# Altium footprint library MYLIB.PcbLib: 600 footprints (part 3 of 39)
Each footprint in its own frame and in the unit in brackets; x right, y up, seen from the top. Pads: shape width x height; smd on the part's side, far side on the other; paste and mask are expansions set on the pad; w line width, h text height; cw(c..) or ccw(c..) is an arc to the next point about the centre after c.
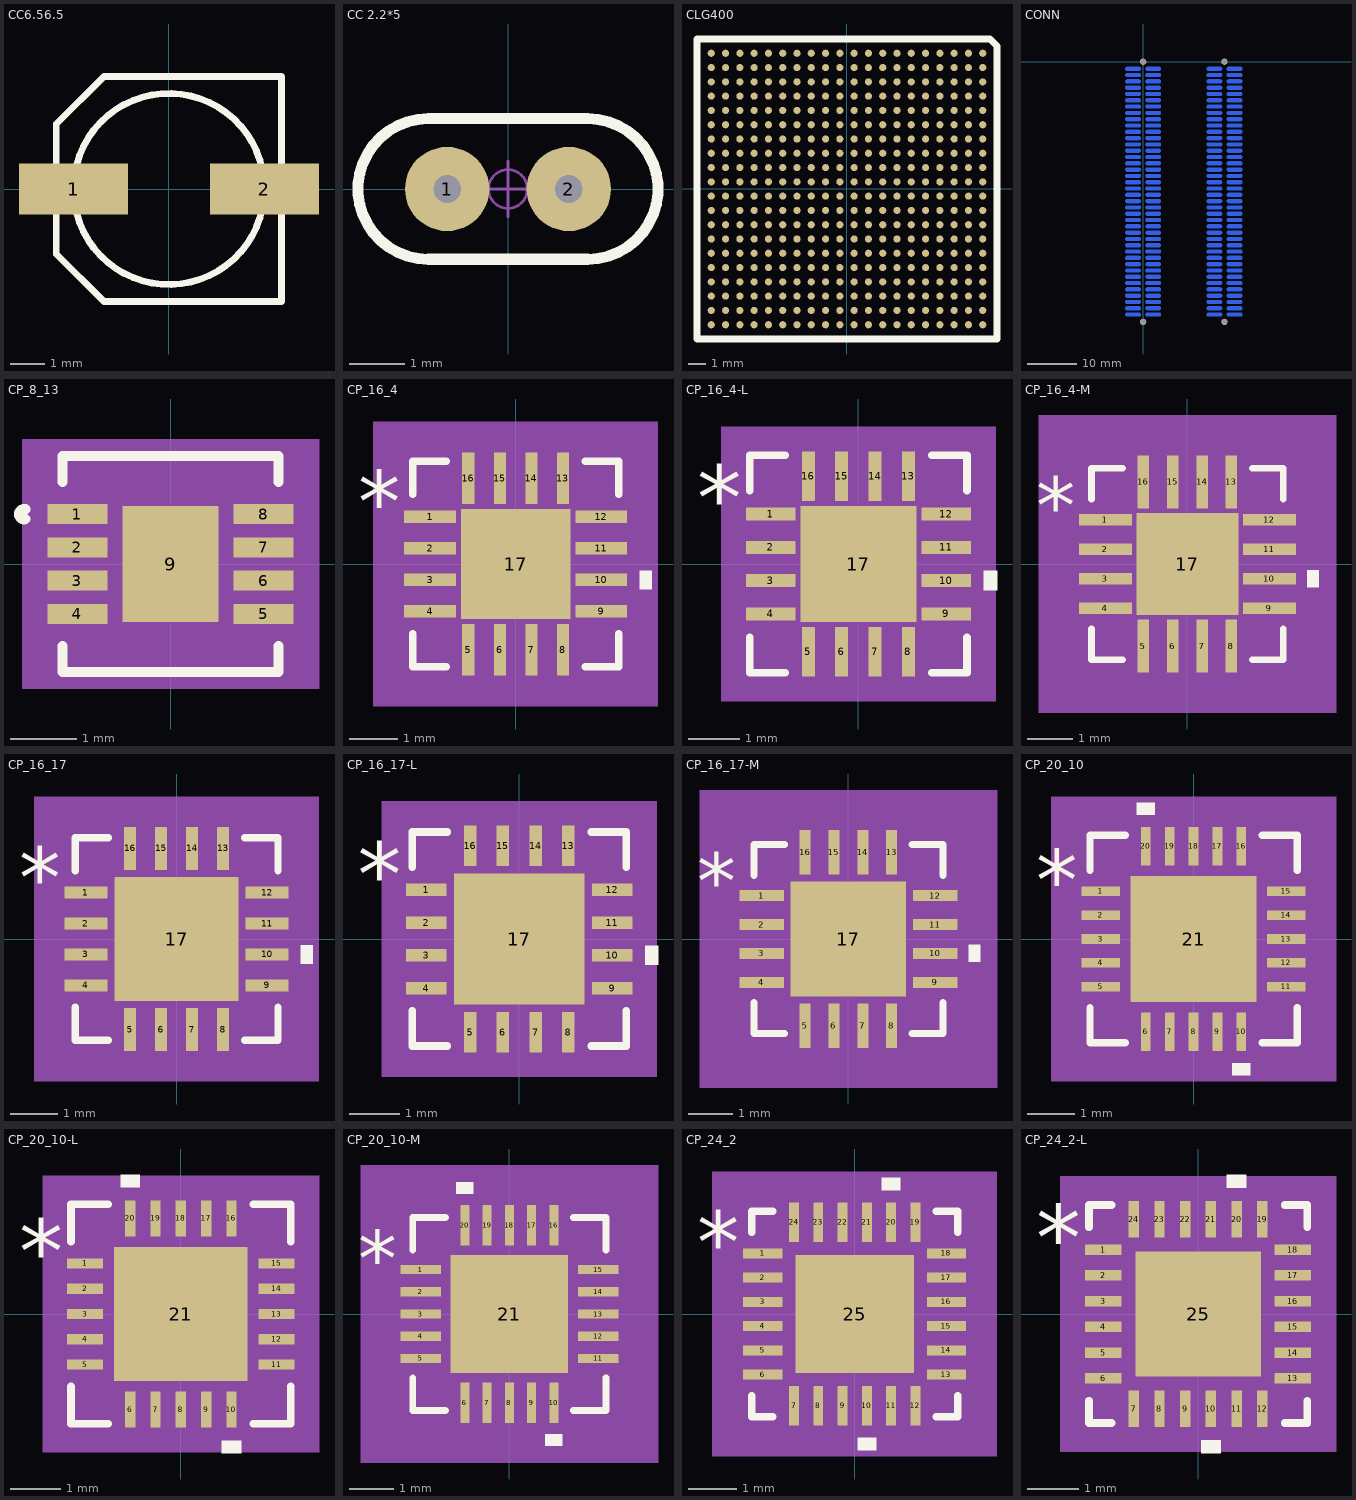
[diagram p2: the footprints below, top view; thin cyan lines are the x and y axes]

## CC6.56.5 [mm]
pads (2):
  rect 3.2x1.5 smd: 1(-2.794,0) 2(2.8,0)
Top Overlay:
  circle w0.2: c0,0 r2.8
  lines w0.2: -3.302,-1.905 -3.302,1.905 -1.905,3.302 3.302,3.302 3.302,-3.302 -1.905,-3.302 -3.302,-1.905

## CC 2.2*5 [mm] "脚距2.2mm直径5mm"
height 6.35
pads (2):
  round 1.524 hole 0.5: 1(-1.1,0) 2(1.1,0)
Top Overlay:
  lines w0.2: -1.44,-1.271 cw(c-1.44,0) -1.44,1.271 1.44,1.271 cw(c1.44,0) 1.44,-1.271 -1.44,-1.269
Mechanical 15:
  circle w0.05: c0,0 r0.35
  lines w0.05: -0.5,0 0.5,0 ; 0,-0.5 0,0.5
3D body "CC 2.2X5.STEP": height 4.8, standoff -3.5, extent -2.4,-0.917 2.4,0.918

## CLG400 [mm]
pads (400):
  round 0.4 smd: A1(7.62,7.595) A2(6.82,7.595) A3(6.02,7.595) A4(5.22,7.595) A5(4.42,7.595) A6(3.62,7.595) A7(2.82,7.595) A8(2.02,7.595) A9(1.22,7.595) A10(0.42,7.595) A11(-0.38,7.595) A12(-1.18,7.595) A13(-1.98,7.595) A14(-2.78,7.595) A15(-3.58,7.595) A16(-4.38,7.595) A17(-5.18,7.595) A18(-5.98,7.595) A19(-6.78,7.595) A20(-7.58,7.595) B1(7.62,6.795) B2(6.82,6.795) B3(6.02,6.795) B4(5.22,6.795) B5(4.42,6.795) B6(3.62,6.795) B7(2.82,6.795) B8(2.02,6.795) B9(1.22,6.795) B10(0.42,6.795) B11(-0.38,6.795) B12(-1.18,6.795) B13(-1.98,6.795) B14(-2.78,6.795) B15(-3.58,6.795) B16(-4.38,6.795) B17(-5.18,6.795) B18(-5.98,6.795) B19(-6.78,6.795) B20(-7.58,6.795) C1(7.62,5.995) C2(6.82,5.995) C3(6.02,5.995) C4(5.22,5.995) C5(4.42,5.995) C6(3.62,5.995) C7(2.82,5.995) C8(2.02,5.995) C9(1.22,5.995) C10(0.42,5.995) C11(-0.38,5.995) C12(-1.18,5.995) C13(-1.98,5.995) C14(-2.78,5.995) C15(-3.58,5.995) C16(-4.38,5.995) C17(-5.18,5.995) C18(-5.98,5.995) C19(-6.78,5.995) C20(-7.58,5.995) D1(7.62,5.195) D2(6.82,5.195) D3(6.02,5.195) D4(5.22,5.195) D5(4.42,5.195) D6(3.62,5.195) D7(2.82,5.195) D8(2.02,5.195) D9(1.22,5.195) D10(0.42,5.195) D11(-0.38,5.195) D12(-1.18,5.195) D13(-1.98,5.195) D14(-2.78,5.195) D15(-3.58,5.195) D16(-4.38,5.195) D17(-5.18,5.195) D18(-5.98,5.195) D19(-6.78,5.195) D20(-7.58,5.195) E1(7.62,4.395) E2(6.82,4.395) E3(6.02,4.395) E4(5.22,4.395) E5(4.42,4.395) E6(3.62,4.395) E7(2.82,4.395) E8(2.02,4.395) E9(1.22,4.395) E10(0.42,4.395) E11(-0.38,4.395) E12(-1.18,4.395) E13(-1.98,4.395) E14(-2.78,4.395) E15(-3.58,4.395) E16(-4.38,4.395) E17(-5.18,4.395) E18(-5.98,4.395) E19(-6.78,4.395) E20(-7.58,4.395) F1(7.62,3.595) F2(6.82,3.595) F3(6.02,3.595) F4(5.22,3.595) F5(4.42,3.595) F6(3.62,3.595) F7(2.82,3.595) F8(2.02,3.595) F9(1.22,3.595) F10(0.42,3.595) F11(-0.38,3.595) F12(-1.18,3.595) F13(-1.98,3.595) F14(-2.78,3.595) F15(-3.58,3.595) F16(-4.38,3.595) F17(-5.18,3.595) F18(-5.98,3.595) F19(-6.78,3.595) F20(-7.58,3.595) G1(7.62,2.795) G2(6.82,2.795) G3(6.02,2.795) G4(5.22,2.795) G5(4.42,2.795) G6(3.62,2.795) G7(2.82,2.795) G8(2.02,2.795) G9(1.22,2.795) G10(0.42,2.795) G11(-0.38,2.795) G12(-1.18,2.795) G13(-1.98,2.795) G14(-2.78,2.795) G15(-3.58,2.795) G16(-4.38,2.795) G17(-5.18,2.795) G18(-5.98,2.795) G19(-6.78,2.795) G20(-7.58,2.795) H1(7.62,1.995) H2(6.82,1.995) H3(6.02,1.995) H4(5.22,1.995) H5(4.42,1.995) H6(3.62,1.995) H7(2.82,1.995) H8(2.02,1.995) H9(1.22,1.995) H10(0.42,1.995) H11(-0.38,1.995) H12(-1.18,1.995) H13(-1.98,1.995) H14(-2.78,1.995) H15(-3.58,1.995) H16(-4.38,1.995) H17(-5.18,1.995) H18(-5.98,1.995) H19(-6.78,1.995) H20(-7.58,1.995) J1(7.62,1.195) J2(6.82,1.195) J3(6.02,1.195) J4(5.22,1.195) J5(4.42,1.195) J6(3.62,1.195) J7(2.82,1.195) J8(2.02,1.195) J9(1.22,1.195) J10(0.42,1.195) J11(-0.38,1.195) J12(-1.18,1.195) J13(-1.98,1.195) J14(-2.78,1.195) J15(-3.58,1.195) J16(-4.38,1.195) J17(-5.18,1.195) J18(-5.98,1.195) J19(-6.78,1.195) J20(-7.58,1.195) K1(7.62,0.395) K2(6.82,0.395) K3(6.02,0.395) K4(5.22,0.395) K5(4.42,0.395) K6(3.62,0.395) K7(2.82,0.395) K8(2.02,0.395) K9(1.22,0.395) K10(0.42,0.395) K11(-0.38,0.395) K12(-1.18,0.395) K13(-1.98,0.395) K14(-2.78,0.395) K15(-3.58,0.395) K16(-4.38,0.395) K17(-5.18,0.395) K18(-5.98,0.395) K19(-6.78,0.395) K20(-7.58,0.395) L1(7.62,-0.405) L2(6.82,-0.405) L3(6.02,-0.405) L4(5.22,-0.405) L5(4.42,-0.405) L6(3.62,-0.405) L7(2.82,-0.405) L8(2.02,-0.405) L9(1.22,-0.405) L10(0.42,-0.405) L11(-0.38,-0.405) L12(-1.18,-0.405) L13(-1.98,-0.405) L14(-2.78,-0.405) L15(-3.58,-0.405) L16(-4.38,-0.405) L17(-5.18,-0.405) L18(-5.98,-0.405) L19(-6.78,-0.405) L20(-7.58,-0.405) M1(7.62,-1.205) M2(6.82,-1.205) M3(6.02,-1.205) M4(5.22,-1.205) M5(4.42,-1.205) M6(3.62,-1.205) M7(2.82,-1.205) M8(2.02,-1.205) M9(1.22,-1.205) M10(0.42,-1.205) M11(-0.38,-1.205) M12(-1.18,-1.205) M13(-1.98,-1.205) M14(-2.78,-1.205) M15(-3.58,-1.205) M16(-4.38,-1.205) M17(-5.18,-1.205) M18(-5.98,-1.205) M19(-6.78,-1.205) M20(-7.58,-1.205) N1(7.62,-2.005) N2(6.82,-2.005) N3(6.02,-2.005) N4(5.22,-2.005) N5(4.42,-2.005) N6(3.62,-2.005) N7(2.82,-2.005) N8(2.02,-2.005) N9(1.22,-2.005) N10(0.42,-2.005) N11(-0.38,-2.005) N12(-1.18,-2.005) N13(-1.98,-2.005) N14(-2.78,-2.005) N15(-3.58,-2.005) N16(-4.38,-2.005) N17(-5.18,-2.005) N18(-5.98,-2.005) N19(-6.78,-2.005) N20(-7.58,-2.005) P1(7.62,-2.805) P2(6.82,-2.805) P3(6.02,-2.805) P4(5.22,-2.805) P5(4.42,-2.805) P6(3.62,-2.805) P7(2.82,-2.805) P8(2.02,-2.805) P9(1.22,-2.805) P10(0.42,-2.805) P11(-0.38,-2.805) P12(-1.18,-2.805) P13(-1.98,-2.805) P14(-2.78,-2.805) P15(-3.58,-2.805) P16(-4.38,-2.805) P17(-5.18,-2.805) P18(-5.98,-2.805) P19(-6.78,-2.805) P20(-7.58,-2.805) R1(7.62,-3.605) R2(6.82,-3.605) R3(6.02,-3.605) R4(5.22,-3.605) R5(4.42,-3.605) R6(3.62,-3.605) R7(2.82,-3.605) R8(2.02,-3.605) R9(1.22,-3.605) R10(0.42,-3.605) R11(-0.38,-3.605) R12(-1.18,-3.605) R13(-1.98,-3.605) R14(-2.78,-3.605) R15(-3.58,-3.605) R16(-4.38,-3.605) R17(-5.18,-3.605) R18(-5.98,-3.605) R19(-6.78,-3.605) R20(-7.58,-3.605) T1(7.62,-4.405) T2(6.82,-4.405) T3(6.02,-4.405) T4(5.22,-4.405) T5(4.42,-4.405) T6(3.62,-4.405) T7(2.82,-4.405) T8(2.02,-4.405) T9(1.22,-4.405) T10(0.42,-4.405) T11(-0.38,-4.405) T12(-1.18,-4.405) T13(-1.98,-4.405) T14(-2.78,-4.405) T15(-3.58,-4.405) T16(-4.38,-4.405) T17(-5.18,-4.405) T18(-5.98,-4.405) T19(-6.78,-4.405) T20(-7.58,-4.405) U1(7.62,-5.205) U2(6.82,-5.205) U3(6.02,-5.205) U4(5.22,-5.205) U5(4.42,-5.205) U6(3.62,-5.205) U7(2.82,-5.205) U8(2.02,-5.205) U9(1.22,-5.205) U10(0.42,-5.205) U11(-0.38,-5.205) U12(-1.18,-5.205) U13(-1.98,-5.205) U14(-2.78,-5.205) U15(-3.58,-5.205) U16(-4.38,-5.205) U17(-5.18,-5.205) U18(-5.98,-5.205) U19(-6.78,-5.205) U20(-7.58,-5.205) V1(7.62,-6.005) V2(6.82,-6.005) V3(6.02,-6.005) V4(5.22,-6.005) V5(4.42,-6.005) V6(3.62,-6.005) V7(2.82,-6.005) V8(2.02,-6.005) V9(1.22,-6.005) V10(0.42,-6.005) V11(-0.38,-6.005) V12(-1.18,-6.005) V13(-1.98,-6.005) V14(-2.78,-6.005) V15(-3.58,-6.005) V16(-4.38,-6.005) V17(-5.18,-6.005) V18(-5.98,-6.005) V19(-6.78,-6.005) V20(-7.58,-6.005) W1(7.62,-6.805) W2(6.82,-6.805) W3(6.02,-6.805) W4(5.22,-6.805) W5(4.42,-6.805) W6(3.62,-6.805) W7(2.82,-6.805) W8(2.02,-6.805) W9(1.22,-6.805) W10(0.42,-6.805) W11(-0.38,-6.805) W12(-1.18,-6.805) W13(-1.98,-6.805) W14(-2.78,-6.805) W15(-3.58,-6.805) W16(-4.38,-6.805) W17(-5.18,-6.805) W18(-5.98,-6.805) W19(-6.78,-6.805) W20(-7.58,-6.805) Y1(7.62,-7.605) Y2(6.82,-7.605) Y3(6.02,-7.605) Y4(5.22,-7.605) Y5(4.42,-7.605) Y6(3.62,-7.605) Y7(2.82,-7.605) Y8(2.02,-7.605) Y9(1.22,-7.605) Y10(0.42,-7.605) Y11(-0.38,-7.605) Y12(-1.18,-7.605) Y13(-1.98,-7.605) Y14(-2.78,-7.605) Y15(-3.58,-7.605) Y16(-4.38,-7.605) Y17(-5.18,-7.605) Y18(-5.98,-7.605) Y19(-6.78,-7.605) Y20(-7.58,-7.605)
Top Overlay:
  lines w0.4: -8.38,-8.405 -8.38,8.395 8.02,8.395 8.42,7.995 8.42,-8.405 -8.38,-8.405

## CONN [mil]
pads (164):
  oval 123x30 smd far side: C1(725.23,-2006.3) C2(725.23,-1956.3) C3(725.23,-1906.3) C4(725.23,-1856.3) C5(725.23,-1806.3) C6(725.23,-1756.3) C7(725.23,-1706.3) C8(725.23,-1656.3) C9(725.23,-1606.3) C10(725.23,-1556.3) C11(725.23,-1506.3) C12(725.23,-1456.3) C13(725.23,-1406.3) C14(725.23,-1356.3) C15(725.23,-1306.3) C16(725.23,-1256.3) C17(725.23,-1206.3) C18(725.23,-1156.3) C19(725.23,-1106.3) C20(725.23,-1056.3) C21(725.23,-1006.3) C22(725.23,-956.3) C23(725.23,-906.3) C24(725.23,-856.3) C25(725.23,-806.3) C26(725.23,-756.3) C27(725.23,-706.3) C28(725.23,-656.3) C29(725.23,-606.3) C30(725.23,-556.3) C31(725.23,-506.3) C32(725.23,-456.3) C33(725.23,-406.3) C34(725.23,-356.3) C35(725.23,-306.3) C36(725.23,-256.3) C37(725.23,-206.3) C38(725.23,-156.3) C39(725.23,-106.3) C40(725.23,-56.3) D1(565.23,-2006.3) D2(565.23,-1956.3) D3(565.23,-1906.3) D4(565.23,-1856.3) D5(565.23,-1806.3) D6(565.23,-1756.3) D7(565.23,-1706.3) D8(565.23,-1656.3) D9(565.23,-1606.3) D10(565.23,-1556.3) D11(565.23,-1506.3) D12(565.23,-1456.3) D13(565.23,-1406.3) D14(565.23,-1356.3) D15(565.23,-1306.3) D16(565.23,-1256.3) D17(565.23,-1206.3) D18(565.23,-1156.3) D19(565.23,-1106.3) D20(565.23,-1056.3) D21(565.23,-1006.3) D22(565.23,-956.3) D23(565.23,-906.3) D24(565.23,-856.3) D25(565.23,-806.3) D26(565.23,-756.3) D27(565.23,-706.3) D28(565.23,-656.3) D29(565.23,-606.3) D30(565.23,-556.3) D31(565.23,-506.3) D32(565.23,-456.3) D33(565.23,-406.3) D34(565.23,-356.3) D35(565.23,-306.3) D36(565.23,-256.3) D37(565.23,-206.3) D38(565.23,-156.3) D39(565.23,-106.3) D40(565.23,-56.3) G1(80.11,-2006.3) G2(80.11,-1956.3) G3(80.11,-1906.3) G4(80.11,-1856.3) G5(80.11,-1806.3) G6(80.11,-1756.3) G7(80.11,-1706.3) G8(80.11,-1656.3) G9(80.11,-1606.3) G10(80.11,-1556.3) G11(80.11,-1506.3) G12(80.11,-1456.3) G13(80.11,-1406.3) G14(80.11,-1356.3) G15(80.11,-1306.3) G16(80.11,-1256.3) G17(80.11,-1206.3) G18(80.11,-1156.3) G19(80.11,-1106.3) G20(80.11,-1056.3) G21(80.11,-1006.3) G22(80.11,-956.3) G23(80.11,-906.3) G24(80.11,-856.3) G25(80.11,-806.3) G26(80.11,-756.3) G27(80.11,-706.3) G28(80.11,-656.3) G29(80.11,-606.3) G30(80.11,-556.3) G31(80.11,-506.3) G32(80.11,-456.3) G33(80.11,-406.3) G34(80.11,-356.3) G35(80.11,-306.3) G36(80.11,-256.3) G37(80.11,-206.3) G38(80.11,-156.3) G39(80.11,-106.3) G40(80.11,-56.3) H1(-79.89,-2006.3) H2(-79.89,-1956.3) H3(-79.89,-1906.3) H4(-79.89,-1856.3) H5(-79.89,-1806.3) H6(-79.89,-1756.3) H7(-79.89,-1706.3) H8(-79.89,-1656.3) H9(-79.89,-1606.3) H10(-79.89,-1556.3) H11(-79.89,-1506.3) H12(-79.89,-1456.3) H13(-79.89,-1406.3) H14(-79.89,-1356.3) H15(-79.89,-1306.3) H16(-79.89,-1256.3) H17(-79.89,-1206.3) H18(-79.89,-1156.3) H19(-79.89,-1106.3) H20(-79.89,-1056.3) H21(-79.89,-1006.3) H22(-79.89,-956.3) H23(-79.89,-906.3) H24(-79.89,-856.3) H25(-79.89,-806.3) H26(-79.89,-756.3) H27(-79.89,-706.3) H28(-79.89,-656.3) H29(-79.89,-606.3) H30(-79.89,-556.3) H31(-79.89,-506.3) H32(-79.89,-456.3) H33(-79.89,-406.3) H34(-79.89,-356.3) H35(-79.89,-306.3) H36(-79.89,-256.3) H37(-79.89,-206.3) H38(-79.89,-156.3) H39(-79.89,-106.3) H40(-79.89,-56.3)
  round 50 hole 43.31 unplated: D41(645.23,0) D42(645.23,-2064.17) H41(0.11,0) H42(0.11,-2064.17)
Bottom Overlay:
  lines w10: -280,180 960,180 960,-2200 720.11,-2200 -279.89,-2200 -279.89,-2120 -279.89,180

## CP_8_13 [mm]
pads (9):
  rect 0.905x0.3 smd: 1(-1.402,0.75) 2(-1.402,0.25) 3(-1.402,-0.25) 4(-1.402,-0.75) 5(1.402,-0.75) 6(1.402,-0.25) 7(1.402,0.25) 8(1.402,0.75)
  rect 1.45x1.74 smd paste-0.857: 9(0,0)
Top Overlay:
  lines w0.152: -2.188,0.676 cw(c-2.206,0.75) -2.188,0.824 ; -1.627,-1.233 -1.627,-1.627 1.627,-1.627 1.627,-1.233 ; -1.627,1.233 -1.627,1.627 1.627,1.627 1.627,1.233
Top Paste:
  region: 0.725,0.87 -0.725,0.87 -0.725,-0.87 0.725,-0.87
Mechanical 5:
  region: 2.236,-1.881 -2.236,-1.881 -2.236,1.881 2.236,1.881
Mechanical 13:
  lines w0: -0.305,1.5 ccw(c0,1.5) 0.305,1.5
  lines w0.025: -1.5,-1.5 1.5,-1.5 1.5,1.5 -1.5,1.5 -1.5,-1.5
Mechanical 15:
  region: -1.754,-1.154 -2.109,-1.154 -2.109,1.154 -1.754,1.154 -1.754,1.754 1.754,1.754 1.754,1.154 2.109,1.154 2.109,-1.154 1.754,-1.154 1.754,-1.754 -1.754,-1.754
  lines w0.152: -2.109,-1.154 -2.109,1.154 -1.754,1.154 -1.754,1.754 1.754,1.754 1.754,1.154 2.109,1.154 2.109,-1.154 1.754,-1.154 1.754,-1.754 -1.754,-1.754 -1.754,-1.154 -2.109,-1.154
3D body: height 0.25, standoff 0, extent 0,0 0.254,0.254

## CP_16_4 [mil]
pads (17):
  rect 42x10 smd paste+0 mask+0: 1(-69.5,38.39) 2(-69.5,12.8) 3(-69.5,-12.8) 4(-69.5,-38.39) 9(69.5,-38.39) 10(69.5,-12.8) 11(69.5,12.8) 12(69.5,38.39)
  rect 10x42 smd paste+0 mask+0: 5(-38.39,-69.5) 6(-12.8,-69.5) 7(12.8,-69.5) 8(38.39,-69.5) 13(38.39,69.5) 14(12.8,69.5) 15(-12.8,69.5) 16(-38.39,69.5)
  rect 89x89 smd paste-44 mask+0: 17(0,0)
Top Overlay:
  region: 100.5,-5.3 110.5,-5.3 110.5,-20.3 100.5,-20.3
  lines w6: -83.5,-56.49 -83.5,-83.5 -56.49,-83.5 ; -83.5,56.49 -83.5,83.5 -56.49,83.5 ; 56.49,-83.5 83.5,-83.5 83.5,-56.49 ; 56.49,83.5 83.5,83.5 83.5,56.49
  text "*" at -128,26.18 h50
Top Paste:
  region: 44.5,44.5 -44.5,44.5 -44.5,-44.5 44.5,-44.5
Mechanical 5:
  region: 115.5,-115.5 -115.5,-115.5 -115.5,115.5 115.5,115.5
Mechanical 13:
  lines w1: -78.5,28.5 -28.5,78.5 ; -78.5,-78.5 78.5,-78.5 78.5,78.5 -78.5,78.5 -78.5,-78.5 ; -78.5,-45.39 -78.5,-31.39 -78.5,-45.39 ; -78.5,-19.8 -78.5,-5.8 -78.5,-19.8 ; -78.5,5.8 -78.5,19.8 -78.5,5.8 ; -78.5,31.39 -78.5,45.39 -78.5,31.39 ; -45.39,-78.5 -31.39,-78.5 -45.39,-78.5 ; -45.39,78.5 -31.39,78.5 -45.39,78.5 ; -19.8,-78.5 -5.8,-78.5 -19.8,-78.5 ; -19.8,78.5 -5.8,78.5 -19.8,78.5 ; 5.8,-78.5 19.8,-78.5 5.8,-78.5 ; 5.8,78.5 19.8,78.5 5.8,78.5 ; 31.39,-78.5 45.39,-78.5 31.39,-78.5 ; 31.39,78.5 45.39,78.5 31.39,78.5 ; 78.5,-45.39 78.5,-31.39 78.5,-45.39 ; 78.5,-19.8 78.5,-5.8 78.5,-19.8 ; 78.5,5.8 78.5,19.8 78.5,5.8 ; 78.5,31.39 78.5,45.39 78.5,31.39
  text "*" at -61,26.18 h50
Mechanical 15:
  region: -53.39,-88.5 -88.5,-88.5 -88.5,-53.39 -100.5,-53.39 -100.5,53.39 -88.5,53.39 -88.5,88.5 -53.39,88.5 -53.39,100.5 53.39,100.5 53.39,88.5 88.5,88.5 88.5,53.39 100.5,53.39 100.5,-53.39 88.5,-53.39 88.5,-88.5 53.39,-88.5 53.39,-100.5 -53.39,-100.5
  lines w6: -100.5,-53.39 -88.5,-53.39 -88.5,-88.5 -53.39,-88.5 -53.39,-100.5 53.39,-100.5 53.39,-88.5 88.5,-88.5 88.5,-53.39 100.5,-53.39 100.5,53.39 88.5,53.39 88.5,88.5 53.39,88.5 53.39,100.5 -53.39,100.5 -53.39,88.5 -88.5,88.5 -88.5,53.39 -100.5,53.39 -100.5,-53.39
3D body: height 10, standoff 0, extent 0,0 10,10

## CP_16_4-L [mil]
pads (17):
  rect 38x10 smd paste+0 mask+0: 1(-67.5,38.39) 2(-67.5,12.8) 3(-67.5,-12.8) 4(-67.5,-38.39) 9(67.5,-38.39) 10(67.5,-12.8) 11(67.5,12.8) 12(67.5,38.39)
  rect 10x38 smd paste+0 mask+0: 5(-38.39,-67.5) 6(-12.8,-67.5) 7(12.8,-67.5) 8(38.39,-67.5) 13(38.39,67.5) 14(12.8,67.5) 15(-12.8,67.5) 16(-38.39,67.5)
  rect 89x89 smd paste-44 mask+0: 17(0,0)
Top Overlay:
  region: 96.5,-5.3 106.5,-5.3 106.5,-20.3 96.5,-20.3
  lines w6: -83.5,-56.49 -83.5,-83.5 -56.49,-83.5 ; -83.5,56.49 -83.5,83.5 -56.49,83.5 ; 56.49,-83.5 83.5,-83.5 83.5,-56.49 ; 56.49,83.5 83.5,83.5 83.5,56.49
  text "*" at -124,26.18 h50
Top Paste:
  region: 44.5,44.5 -44.5,44.5 -44.5,-44.5 44.5,-44.5
Mechanical 5:
  region: 105.5,-105.5 -105.5,-105.5 -105.5,105.5 105.5,105.5
Mechanical 13:
  lines w1: -78.5,28.5 -28.5,78.5 ; -78.5,-78.5 -78.5,78.5 78.5,78.5 78.5,-78.5 -78.5,-78.5 ; -78.5,-45.39 -78.5,-31.39 -78.5,-45.39 ; -78.5,-19.8 -78.5,-5.8 -78.5,-19.8 ; -78.5,5.8 -78.5,19.8 -78.5,5.8 ; -78.5,31.39 -78.5,45.39 -78.5,31.39 ; -45.39,-78.5 -31.39,-78.5 -45.39,-78.5 ; -45.39,78.5 -31.39,78.5 -45.39,78.5 ; -19.8,-78.5 -5.8,-78.5 -19.8,-78.5 ; -19.8,78.5 -5.8,78.5 -19.8,78.5 ; 5.8,-78.5 19.8,-78.5 5.8,-78.5 ; 5.8,78.5 19.8,78.5 5.8,78.5 ; 31.39,-78.5 45.39,-78.5 31.39,-78.5 ; 31.39,78.5 45.39,78.5 31.39,78.5 ; 78.5,-45.39 78.5,-31.39 78.5,-45.39 ; 78.5,-19.8 78.5,-5.8 78.5,-19.8 ; 78.5,5.8 78.5,19.8 78.5,5.8 ; 78.5,31.39 78.5,45.39 78.5,31.39
  text "*" at -61,26.18 h50
Mechanical 15:
  region: -47.39,-82.5 -82.5,-82.5 -82.5,-47.39 -90.5,-47.39 -90.5,47.39 -82.5,47.39 -82.5,82.5 -47.39,82.5 -47.39,90.5 47.39,90.5 47.39,82.5 82.5,82.5 82.5,47.39 90.5,47.39 90.5,-47.39 82.5,-47.39 82.5,-82.5 47.39,-82.5 47.39,-90.5 -47.39,-90.5
  lines w6: -90.5,-47.39 -90.5,47.39 -82.5,47.39 -82.5,82.5 -47.39,82.5 -47.39,90.5 47.39,90.5 47.39,82.5 82.5,82.5 82.5,47.39 90.5,47.39 90.5,-47.39 82.5,-47.39 82.5,-82.5 47.39,-82.5 47.39,-90.5 -47.39,-90.5 -47.39,-82.5 -82.5,-82.5 -82.5,-47.39 -90.5,-47.39
3D body: height 10, standoff 0, extent 0,0 10,10

## CP_16_4-M [mil]
pads (17):
  rect 46x10 smd paste+0 mask+0: 1(-71.5,38.39) 2(-71.5,12.8) 3(-71.5,-12.8) 4(-71.5,-38.39) 9(71.5,-38.39) 10(71.5,-12.8) 11(71.5,12.8) 12(71.5,38.39)
  rect 10x46 smd paste+0 mask+0: 5(-38.39,-71.5) 6(-12.8,-71.5) 7(12.8,-71.5) 8(38.39,-71.5) 13(38.39,71.5) 14(12.8,71.5) 15(-12.8,71.5) 16(-38.39,71.5)
  rect 89x89 smd paste-44 mask+0: 17(0,0)
Top Overlay:
  region: 104.5,-5.3 114.5,-5.3 114.5,-20.3 104.5,-20.3
  lines w6: -83.5,-56.49 -83.5,-83.5 -56.49,-83.5 ; -83.5,56.49 -83.5,83.5 -56.49,83.5 ; 56.49,-83.5 83.5,-83.5 83.5,-56.49 ; 56.49,83.5 83.5,83.5 83.5,56.49
  text "*" at -132,26.18 h50
Top Paste:
  region: 44.5,44.5 -44.5,44.5 -44.5,-44.5 44.5,-44.5
Mechanical 5:
  region: 129.5,-129.5 -129.5,-129.5 -129.5,129.5 129.5,129.5
Mechanical 13:
  lines w1: -78.5,28.5 -28.5,78.5 ; -78.5,-78.5 -78.5,78.5 78.5,78.5 78.5,-78.5 -78.5,-78.5 ; -78.5,-45.39 -78.5,-31.39 -78.5,-45.39 ; -78.5,-19.8 -78.5,-5.8 -78.5,-19.8 ; -78.5,5.8 -78.5,19.8 -78.5,5.8 ; -78.5,31.39 -78.5,45.39 -78.5,31.39 ; -45.39,-78.5 -31.39,-78.5 -45.39,-78.5 ; -45.39,78.5 -31.39,78.5 -45.39,78.5 ; -19.8,-78.5 -5.8,-78.5 -19.8,-78.5 ; -19.8,78.5 -5.8,78.5 -19.8,78.5 ; 5.8,-78.5 19.8,-78.5 5.8,-78.5 ; 5.8,78.5 19.8,78.5 5.8,78.5 ; 31.39,-78.5 45.39,-78.5 31.39,-78.5 ; 31.39,78.5 45.39,78.5 31.39,78.5 ; 78.5,-45.39 78.5,-31.39 78.5,-45.39 ; 78.5,-19.8 78.5,-5.8 78.5,-19.8 ; 78.5,5.8 78.5,19.8 78.5,5.8 ; 78.5,31.39 78.5,45.39 78.5,31.39
  text "*" at -61,26.18 h50
Mechanical 15:
  region: -63.39,-98.5 -98.5,-98.5 -98.5,-63.39 -114.5,-63.39 -114.5,63.39 -98.5,63.39 -98.5,98.5 -63.39,98.5 -63.39,114.5 63.39,114.5 63.39,98.5 98.5,98.5 98.5,63.39 114.5,63.39 114.5,-63.39 98.5,-63.39 98.5,-98.5 63.39,-98.5 63.39,-114.5 -63.39,-114.5
  lines w6: -114.5,-63.39 -114.5,63.39 -98.5,63.39 -98.5,98.5 -63.39,98.5 -63.39,114.5 63.39,114.5 63.39,98.5 98.5,98.5 98.5,63.39 114.5,63.39 114.5,-63.39 98.5,-63.39 98.5,-98.5 63.39,-98.5 63.39,-114.5 -63.39,-114.5 -63.39,-98.5 -98.5,-98.5 -98.5,-63.39 -114.5,-63.39
3D body: height 10, standoff 0, extent 0,0 10,10

## CP_16_17 [mm]
pads (17):
  rect 0.905x0.248 smd paste+0 mask+0: 1(-1.902,0.975) 2(-1.902,0.325) 3(-1.902,-0.325) 4(-1.902,-0.975) 9(1.902,-0.975) 10(1.902,-0.325) 11(1.902,0.325) 12(1.902,0.975)
  rect 0.248x0.905 smd paste+0 mask+0: 5(-0.975,-1.902) 6(-0.325,-1.902) 7(0.325,-1.902) 8(0.975,-1.902) 13(0.975,1.902) 14(0.325,1.902) 15(-0.325,1.902) 16(-0.975,1.902)
  rect 2.6x2.6 smd paste-1.287 mask+0: 17(0,0)
Top Overlay:
  region: 2.609,-0.135 2.863,-0.135 2.863,-0.516 2.609,-0.516
  lines w0.152: -2.127,-1.432 -2.127,-2.127 -1.432,-2.127 ; -2.127,1.432 -2.127,2.127 -1.432,2.127 ; 1.432,-2.127 2.127,-2.127 2.127,-1.432 ; 1.432,2.127 2.127,2.127 2.127,1.432
  text "*" at -3.307,0.665 h1.27
Top Paste:
  region: -0.1,1.2 -1.2,1.2 -1.2,0.1 -0.1,0.1
  region: -0.1,-0.1 -1.2,-0.1 -1.2,-1.2 -0.1,-1.2
  region: 1.2,1.2 0.1,1.2 0.1,0.1 1.2,0.1
  region: 1.2,-0.1 0.1,-0.1 0.1,-1.2 1.2,-1.2
Mechanical 5:
  region: 2.99,-2.99 -2.99,-2.99 -2.99,2.99 2.99,2.99
Mechanical 13:
  lines w0.025: -2,0.73 -0.73,2 ; -2.05,-1.15 -2.05,-0.8 -2,-0.8 -2,-1.15 -2.05,-1.15 ; -2.05,-0.5 -2.05,-0.15 -2,-0.15 -2,-0.5 -2.05,-0.5 ; -2.05,0.15 -2.05,0.5 -2,0.5 -2,0.15 -2.05,0.15 ; -2.05,0.8 -2.05,1.15 -2,1.15 -2,0.8 -2.05,0.8 ; -2,-2 2,-2 2,2 -2,2 -2,-2 ; -1.15,-2.05 -1.15,-2 -0.8,-2 -0.8,-2.05 -1.15,-2.05 ; -1.15,2 -0.8,2 -0.8,2.05 -1.15,2.05 -1.15,2 ; -0.5,-2.05 -0.5,-2 -0.15,-2 -0.15,-2.05 -0.5,-2.05 ; -0.5,2 -0.15,2 -0.15,2.05 -0.5,2.05 -0.5,2 ; 0.15,-2.05 0.15,-2 0.5,-2 0.5,-2.05 0.15,-2.05 ; 0.15,2 0.5,2 0.5,2.05 0.15,2.05 0.15,2 ; 0.8,-2.05 0.8,-2 1.15,-2 1.15,-2.05 0.8,-2.05 ; 0.8,2 1.15,2 1.15,2.05 0.8,2.05 0.8,2 ; 2,-1.15 2,-0.8 2.05,-0.8 2.05,-1.15 2,-1.15 ; 2,-0.5 2,-0.15 2.05,-0.15 2.05,-0.5 2,-0.5 ; 2,0.15 2,0.5 2.05,0.5 2.05,0.15 2,0.15 ; 2,0.8 2,1.15 2.05,1.15 2.05,0.8 2,0.8
  text "*" at -1.767,0.665 h1.27
Mechanical 15:
  region: -1.353,-2.254 -2.254,-2.254 -2.254,-1.353 -2.609,-1.353 -2.609,1.353 -2.254,1.353 -2.254,2.254 -1.353,2.254 -1.353,2.609 1.353,2.609 1.353,2.254 2.254,2.254 2.254,1.353 2.609,1.353 2.609,-1.353 2.254,-1.353 2.254,-2.254 1.353,-2.254 1.353,-2.609 -1.353,-2.609
  lines w0.152: -2.609,-1.353 -2.254,-1.353 -2.254,-2.254 -1.353,-2.254 -1.353,-2.609 1.353,-2.609 1.353,-2.254 2.254,-2.254 2.254,-1.353 2.609,-1.353 2.609,1.353 2.254,1.353 2.254,2.254 1.353,2.254 1.353,2.609 -1.353,2.609 -1.353,2.254 -2.254,2.254 -2.254,1.353 -2.609,1.353 -2.609,-1.353
3D body: height 0.25, standoff 0, extent 0,0 0.254,0.254

## CP_16_17-L [mm]
pads (17):
  rect 0.803x0.248 smd paste+0 mask+0: 1(-1.852,0.975) 2(-1.852,0.325) 3(-1.852,-0.325) 4(-1.852,-0.975) 9(1.852,-0.975) 10(1.852,-0.325) 11(1.852,0.325) 12(1.852,0.975)
  rect 0.248x0.803 smd paste+0 mask+0: 5(-0.975,-1.852) 6(-0.325,-1.852) 7(0.325,-1.852) 8(0.975,-1.852) 13(0.975,1.852) 14(0.325,1.852) 15(-0.325,1.852) 16(-0.975,1.852)
  rect 2.6x2.6 smd paste-1.287 mask+0: 17(0,0)
Top Overlay:
  region: 2.507,-0.135 2.761,-0.135 2.761,-0.516 2.507,-0.516
  lines w0.152: -2.127,-1.432 -2.127,-2.127 -1.432,-2.127 ; -2.127,1.432 -2.127,2.127 -1.432,2.127 ; 1.432,-2.127 2.127,-2.127 2.127,-1.432 ; 1.432,2.127 2.127,2.127 2.127,1.432
  text "*" at -3.206,0.665 h1.27
Top Paste:
  region: -0.1,1.2 -1.2,1.2 -1.2,0.1 -0.1,0.1
  region: -0.1,-0.1 -1.2,-0.1 -1.2,-1.2 -0.1,-1.2
  region: 1.2,1.2 0.1,1.2 0.1,0.1 1.2,0.1
  region: 1.2,-0.1 0.1,-0.1 0.1,-1.2 1.2,-1.2
Mechanical 5:
  region: 2.736,-2.736 -2.736,-2.736 -2.736,2.736 2.736,2.736
Mechanical 13:
  lines w0.025: -2,0.73 -0.73,2 ; -2.05,-1.15 -2.05,-0.8 -2,-0.8 -2,-1.15 -2.05,-1.15 ; -2.05,-0.5 -2.05,-0.15 -2,-0.15 -2,-0.5 -2.05,-0.5 ; -2.05,0.15 -2.05,0.5 -2,0.5 -2,0.15 -2.05,0.15 ; -2.05,0.8 -2.05,1.15 -2,1.15 -2,0.8 -2.05,0.8 ; -2,-2 2,-2 2,2 -2,2 -2,-2 ; -1.15,-2.05 -1.15,-2 -0.8,-2 -0.8,-2.05 -1.15,-2.05 ; -1.15,2 -0.8,2 -0.8,2.05 -1.15,2.05 -1.15,2 ; -0.5,-2.05 -0.5,-2 -0.15,-2 -0.15,-2.05 -0.5,-2.05 ; -0.5,2 -0.15,2 -0.15,2.05 -0.5,2.05 -0.5,2 ; 0.15,-2.05 0.15,-2 0.5,-2 0.5,-2.05 0.15,-2.05 ; 0.15,2 0.5,2 0.5,2.05 0.15,2.05 0.15,2 ; 0.8,-2.05 0.8,-2 1.15,-2 1.15,-2.05 0.8,-2.05 ; 0.8,2 1.15,2 1.15,2.05 0.8,2.05 0.8,2 ; 2,-1.15 2,-0.8 2.05,-0.8 2.05,-1.15 2,-1.15 ; 2,-0.5 2,-0.15 2.05,-0.15 2.05,-0.5 2,-0.5 ; 2,0.15 2,0.5 2.05,0.5 2.05,0.15 2,0.15 ; 2,0.8 2,1.15 2.05,1.15 2.05,0.8 2,0.8
  text "*" at -1.767,0.665 h1.27
Mechanical 15:
  region: -1.201,-2.102 -2.102,-2.102 -2.102,-1.201 -2.355,-1.201 -2.355,1.201 -2.102,1.201 -2.102,2.102 -1.201,2.102 -1.201,2.355 1.201,2.355 1.201,2.102 2.102,2.102 2.102,1.201 2.355,1.201 2.355,-1.201 2.102,-1.201 2.102,-2.102 1.201,-2.102 1.201,-2.355 -1.201,-2.355
  lines w0.152: -2.355,-1.201 -2.102,-1.201 -2.102,-2.102 -1.201,-2.102 -1.201,-2.355 1.201,-2.355 1.201,-2.102 2.102,-2.102 2.102,-1.201 2.355,-1.201 2.355,1.201 2.102,1.201 2.102,2.102 1.201,2.102 1.201,2.355 -1.201,2.355 -1.201,2.102 -2.102,2.102 -2.102,1.201 -2.355,1.201 -2.355,-1.201
3D body: height 0.25, standoff 0, extent 0,0 0.254,0.254

## CP_16_17-M [mm]
pads (17):
  rect 1.006x0.248 smd paste+0 mask+0: 1(-1.953,0.975) 2(-1.953,0.325) 3(-1.953,-0.325) 4(-1.953,-0.975) 9(1.953,-0.975) 10(1.953,-0.325) 11(1.953,0.325) 12(1.953,0.975)
  rect 0.248x1.006 smd paste+0 mask+0: 5(-0.975,-1.953) 6(-0.325,-1.953) 7(0.325,-1.953) 8(0.975,-1.953) 13(0.975,1.953) 14(0.325,1.953) 15(-0.325,1.953) 16(-0.975,1.953)
  rect 2.6x2.6 smd paste-1.287 mask+0: 17(0,0)
Top Overlay:
  region: 2.71,-0.135 2.964,-0.135 2.964,-0.516 2.71,-0.516
  lines w0.152: -2.127,-1.432 -2.127,-2.127 -1.432,-2.127 ; -2.127,1.432 -2.127,2.127 -1.432,2.127 ; 1.432,-2.127 2.127,-2.127 2.127,-1.432 ; 1.432,2.127 2.127,2.127 2.127,1.432
  text "*" at -3.409,0.665 h1.27
Top Paste:
  region: -0.1,1.2 -1.2,1.2 -1.2,0.1 -0.1,0.1
  region: -0.1,-0.1 -1.2,-0.1 -1.2,-1.2 -0.1,-1.2
  region: 1.2,1.2 0.1,1.2 0.1,0.1 1.2,0.1
  region: 1.2,-0.1 0.1,-0.1 0.1,-1.2 1.2,-1.2
Mechanical 5:
  region: 3.345,-3.345 -3.345,-3.345 -3.345,3.345 3.345,3.345
Mechanical 13:
  lines w0.025: -2,0.73 -0.73,2 ; -2.05,-1.15 -2.05,-0.8 -2,-0.8 -2,-1.15 -2.05,-1.15 ; -2.05,-0.5 -2.05,-0.15 -2,-0.15 -2,-0.5 -2.05,-0.5 ; -2.05,0.15 -2.05,0.5 -2,0.5 -2,0.15 -2.05,0.15 ; -2.05,0.8 -2.05,1.15 -2,1.15 -2,0.8 -2.05,0.8 ; -2,-2 2,-2 2,2 -2,2 -2,-2 ; -1.15,-2.05 -1.15,-2 -0.8,-2 -0.8,-2.05 -1.15,-2.05 ; -1.15,2 -0.8,2 -0.8,2.05 -1.15,2.05 -1.15,2 ; -0.5,-2.05 -0.5,-2 -0.15,-2 -0.15,-2.05 -0.5,-2.05 ; -0.5,2 -0.15,2 -0.15,2.05 -0.5,2.05 -0.5,2 ; 0.15,-2.05 0.15,-2 0.5,-2 0.5,-2.05 0.15,-2.05 ; 0.15,2 0.5,2 0.5,2.05 0.15,2.05 0.15,2 ; 0.8,-2.05 0.8,-2 1.15,-2 1.15,-2.05 0.8,-2.05 ; 0.8,2 1.15,2 1.15,2.05 0.8,2.05 0.8,2 ; 2,-1.15 2,-0.8 2.05,-0.8 2.05,-1.15 2,-1.15 ; 2,-0.5 2,-0.15 2.05,-0.15 2.05,-0.5 2,-0.5 ; 2,0.15 2,0.5 2.05,0.5 2.05,0.15 2,0.15 ; 2,0.8 2,1.15 2.05,1.15 2.05,0.8 2,0.8
  text "*" at -1.767,0.665 h1.27
Mechanical 15:
  region: -1.607,-2.508 -2.508,-2.508 -2.508,-1.607 -2.964,-1.607 -2.964,1.607 -2.508,1.607 -2.508,2.508 -1.607,2.508 -1.607,2.964 1.607,2.964 1.607,2.508 2.508,2.508 2.508,1.607 2.964,1.607 2.964,-1.607 2.508,-1.607 2.508,-2.508 1.607,-2.508 1.607,-2.964 -1.607,-2.964
  lines w0.152: -2.964,-1.607 -2.508,-1.607 -2.508,-2.508 -1.607,-2.508 -1.607,-2.964 1.607,-2.964 1.607,-2.508 2.508,-2.508 2.508,-1.607 2.964,-1.607 2.964,1.607 2.508,1.607 2.508,2.508 1.607,2.508 1.607,2.964 -1.607,2.964 -1.607,2.508 -2.508,2.508 -2.508,1.607 -2.964,1.607 -2.964,-1.607
3D body: height 0.25, standoff 0, extent 0,0 0.254,0.254

## CP_20_10 [mil]
pads (21):
  rect 32x8 smd paste+0 mask+0: 1(-76.5,39.37) 2(-76.5,19.68) 3(-76.5,0) 4(-76.5,-19.68) 5(-76.5,-39.37) 11(76.5,-39.37) 12(76.5,-19.68) 13(76.5,0) 14(76.5,19.68) 15(76.5,39.37)
  rect 8x32 smd paste+0 mask+0: 6(-39.37,-76.5) 7(-19.68,-76.5) 8(0,-76.5) 9(19.68,-76.5) 10(39.37,-76.5) 16(39.37,76.5) 17(19.68,76.5) 18(0,76.5) 19(-19.68,76.5) 20(-39.37,76.5)
  rect 104x104 smd paste-51.5 mask+0: 21(0,0)
Top Overlay:
  region: 46.87,-102.5 31.87,-102.5 31.87,-112.5 46.87,-112.5
  region: -31.87,102.5 -46.87,102.5 -46.87,112.5 -31.87,112.5
  lines w6: -85.5,-56.47 -85.5,-85.5 -56.47,-85.5 ; -85.5,56.47 -85.5,85.5 -56.47,85.5 ; 56.47,-85.5 85.5,-85.5 85.5,-56.47 ; 56.47,85.5 85.5,85.5 85.5,56.47
  text "*" at -130,24.21 h50
Top Paste:
  region: -3.94,48.06 -48.06,48.06 -48.06,3.94 -3.94,3.94
  region: -3.94,-3.94 -48.06,-3.94 -48.06,-48.06 -3.94,-48.06
  region: 48.06,48.06 3.94,48.06 3.94,3.94 48.06,3.94
  region: 48.06,-3.94 3.94,-3.94 3.94,-48.06 48.06,-48.06
Mechanical 5:
  region: 117.5,-117.5 -117.5,-117.5 -117.5,117.5 117.5,117.5
Mechanical 13:
  lines w1: -80.5,30.5 -30.5,80.5 ; -80.5,-80.5 80.5,-80.5 80.5,80.5 -80.5,80.5 -80.5,-80.5 ; -80.5,-45.37 -80.5,-33.37 -80.5,-45.37 ; -80.5,-25.68 -80.5,-13.69 -80.5,-25.68 ; -80.5,-6 -80.5,6 -80.5,-6 ; -80.5,13.69 -80.5,25.68 -80.5,13.69 ; -80.5,33.37 -80.5,45.37 -80.5,33.37 ; -45.37,-80.5 -33.37,-80.5 -45.37,-80.5 ; -45.37,80.5 -33.37,80.5 -45.37,80.5 ; -25.68,-80.5 -13.69,-80.5 -25.68,-80.5 ; -25.68,80.5 -13.69,80.5 -25.68,80.5 ; -6,-80.5 6,-80.5 -6,-80.5 ; -6,80.5 6,80.5 -6,80.5 ; 13.69,-80.5 25.68,-80.5 13.69,-80.5 ; 13.69,80.5 25.68,80.5 13.69,80.5 ; 33.37,-80.5 45.37,-80.5 33.37,-80.5 ; 33.37,80.5 45.37,80.5 33.37,80.5 ; 80.5,-45.37 80.5,-33.37 80.5,-45.37 ; 80.5,-25.68 80.5,-13.69 80.5,-25.68 ; 80.5,-6 80.5,6 80.5,-6 ; 80.5,13.69 80.5,25.68 80.5,13.69 ; 80.5,33.37 80.5,45.37 80.5,33.37
  text "*" at -73,24.21 h50
Mechanical 15:
  region: -53.37,-90.5 -90.5,-90.5 -90.5,-53.37 -102.5,-53.37 -102.5,53.37 -90.5,53.37 -90.5,90.5 -53.37,90.5 -53.37,102.5 53.37,102.5 53.37,90.5 90.5,90.5 90.5,53.37 102.5,53.37 102.5,-53.37 90.5,-53.37 90.5,-90.5 53.37,-90.5 53.37,-102.5 -53.37,-102.5
  lines w6: -102.5,-53.37 -90.5,-53.37 -90.5,-90.5 -53.37,-90.5 -53.37,-102.5 53.37,-102.5 53.37,-90.5 90.5,-90.5 90.5,-53.37 102.5,-53.37 102.5,53.37 90.5,53.37 90.5,90.5 53.37,90.5 53.37,102.5 -53.37,102.5 -53.37,90.5 -90.5,90.5 -90.5,53.37 -102.5,53.37 -102.5,-53.37
3D body: height 10, standoff 0, extent 0,0 10,10

## CP_20_10-L [mil]
pads (21):
  rect 28x8 smd paste+0 mask+0: 1(-74.5,39.37) 2(-74.5,19.68) 3(-74.5,0) 4(-74.5,-19.68) 5(-74.5,-39.37) 11(74.5,-39.37) 12(74.5,-19.68) 13(74.5,0) 14(74.5,19.68) 15(74.5,39.37)
  rect 8x28 smd paste+0 mask+0: 6(-39.37,-74.5) 7(-19.68,-74.5) 8(0,-74.5) 9(19.68,-74.5) 10(39.37,-74.5) 16(39.37,74.5) 17(19.68,74.5) 18(0,74.5) 19(-19.68,74.5) 20(-39.37,74.5)
  rect 104x104 smd paste-51.5 mask+0: 21(0,0)
Top Overlay:
  region: -31.87,98.5 -46.87,98.5 -46.87,108.5 -31.87,108.5
  region: 46.87,-98.5 31.87,-98.5 31.87,-108.5 46.87,-108.5
  lines w6: -85.5,-56.47 -85.5,-85.5 -56.47,-85.5 ; -85.5,56.47 -85.5,85.5 -56.47,85.5 ; 56.47,-85.5 85.5,-85.5 85.5,-56.47 ; 56.47,85.5 85.5,85.5 85.5,56.47
  text "*" at -126,24.21 h50
Top Paste:
  region: 48.06,-3.94 3.94,-3.94 3.94,-48.06 48.06,-48.06
  region: 48.06,48.06 3.94,48.06 3.94,3.94 48.06,3.94
  region: -3.94,-3.94 -48.06,-3.94 -48.06,-48.06 -3.94,-48.06
  region: -3.94,48.06 -48.06,48.06 -48.06,3.94 -3.94,3.94
Mechanical 5:
  region: 107.5,-107.5 -107.5,-107.5 -107.5,107.5 107.5,107.5
Mechanical 13:
  lines w1: -80.5,30.5 -30.5,80.5 ; -80.5,-80.5 -80.5,80.5 80.5,80.5 80.5,-80.5 -80.5,-80.5 ; -80.5,-45.37 -80.5,-33.37 -80.5,-45.37 ; -80.5,-25.68 -80.5,-13.69 -80.5,-25.68 ; -80.5,-6 -80.5,6 -80.5,-6 ; -80.5,13.69 -80.5,25.68 -80.5,13.69 ; -80.5,33.37 -80.5,45.37 -80.5,33.37 ; -45.37,-80.5 -33.37,-80.5 -45.37,-80.5 ; -45.37,80.5 -33.37,80.5 -45.37,80.5 ; -25.68,-80.5 -13.69,-80.5 -25.68,-80.5 ; -25.68,80.5 -13.69,80.5 -25.68,80.5 ; -6,-80.5 6,-80.5 -6,-80.5 ; -6,80.5 6,80.5 -6,80.5 ; 13.69,-80.5 25.68,-80.5 13.69,-80.5 ; 13.69,80.5 25.68,80.5 13.69,80.5 ; 33.37,-80.5 45.37,-80.5 33.37,-80.5 ; 33.37,80.5 45.37,80.5 33.37,80.5 ; 80.5,-45.37 80.5,-33.37 80.5,-45.37 ; 80.5,-25.68 80.5,-13.69 80.5,-25.68 ; 80.5,-6 80.5,6 80.5,-6 ; 80.5,13.69 80.5,25.68 80.5,13.69 ; 80.5,33.37 80.5,45.37 80.5,33.37
  text "*" at -73,24.21 h50
Mechanical 15:
  region: -47.37,-84.5 -84.5,-84.5 -84.5,-47.37 -92.5,-47.37 -92.5,47.37 -84.5,47.37 -84.5,84.5 -47.37,84.5 -47.37,92.5 47.37,92.5 47.37,84.5 84.5,84.5 84.5,47.37 92.5,47.37 92.5,-47.37 84.5,-47.37 84.5,-84.5 47.37,-84.5 47.37,-92.5 -47.37,-92.5
  lines w6: -92.5,-47.37 -92.5,47.37 -84.5,47.37 -84.5,84.5 -47.37,84.5 -47.37,92.5 47.37,92.5 47.37,84.5 84.5,84.5 84.5,47.37 92.5,47.37 92.5,-47.37 84.5,-47.37 84.5,-84.5 47.37,-84.5 47.37,-92.5 -47.37,-92.5 -47.37,-84.5 -84.5,-84.5 -84.5,-47.37 -92.5,-47.37
3D body: height 10, standoff 0, extent 0,0 10,10

## CP_20_10-M [mil]
pads (21):
  rect 36x8 smd paste+0 mask+0: 1(-78.5,39.37) 2(-78.5,19.68) 3(-78.5,0) 4(-78.5,-19.68) 5(-78.5,-39.37) 11(78.5,-39.37) 12(78.5,-19.68) 13(78.5,0) 14(78.5,19.68) 15(78.5,39.37)
  rect 8x36 smd paste+0 mask+0: 6(-39.37,-78.5) 7(-19.68,-78.5) 8(0,-78.5) 9(19.68,-78.5) 10(39.37,-78.5) 16(39.37,78.5) 17(19.68,78.5) 18(0,78.5) 19(-19.68,78.5) 20(-39.37,78.5)
  rect 104x104 smd paste-51.5 mask+0: 21(0,0)
Top Overlay:
  region: 46.87,-106.5 31.87,-106.5 31.87,-116.5 46.87,-116.5
  region: -31.87,106.5 -46.87,106.5 -46.87,116.5 -31.87,116.5
  lines w6: -85.5,-56.47 -85.5,-85.5 -56.47,-85.5 ; -85.5,56.47 -85.5,85.5 -56.47,85.5 ; 56.47,-85.5 85.5,-85.5 85.5,-56.47 ; 56.47,85.5 85.5,85.5 85.5,56.47
  text "*" at -134,24.21 h50
Top Paste:
  region: -3.94,48.06 -48.06,48.06 -48.06,3.94 -3.94,3.94
  region: -3.94,-3.94 -48.06,-3.94 -48.06,-48.06 -3.94,-48.06
  region: 48.06,48.06 3.94,48.06 3.94,3.94 48.06,3.94
  region: 48.06,-3.94 3.94,-3.94 3.94,-48.06 48.06,-48.06
Mechanical 5:
  region: 131.5,-131.5 -131.5,-131.5 -131.5,131.5 131.5,131.5
Mechanical 13:
  lines w1: -80.5,30.5 -30.5,80.5 ; -80.5,-80.5 80.5,-80.5 80.5,80.5 -80.5,80.5 -80.5,-80.5 ; -80.5,-45.37 -80.5,-33.37 -80.5,-45.37 ; -80.5,-25.68 -80.5,-13.69 -80.5,-25.68 ; -80.5,-6 -80.5,6 -80.5,-6 ; -80.5,13.69 -80.5,25.68 -80.5,13.69 ; -80.5,33.37 -80.5,45.37 -80.5,33.37 ; -45.37,-80.5 -33.37,-80.5 -45.37,-80.5 ; -45.37,80.5 -33.37,80.5 -45.37,80.5 ; -25.68,-80.5 -13.69,-80.5 -25.68,-80.5 ; -25.68,80.5 -13.69,80.5 -25.68,80.5 ; -6,-80.5 6,-80.5 -6,-80.5 ; -6,80.5 6,80.5 -6,80.5 ; 13.69,-80.5 25.68,-80.5 13.69,-80.5 ; 13.69,80.5 25.68,80.5 13.69,80.5 ; 33.37,-80.5 45.37,-80.5 33.37,-80.5 ; 33.37,80.5 45.37,80.5 33.37,80.5 ; 80.5,-45.37 80.5,-33.37 80.5,-45.37 ; 80.5,-25.68 80.5,-13.69 80.5,-25.68 ; 80.5,-6 80.5,6 80.5,-6 ; 80.5,13.69 80.5,25.68 80.5,13.69 ; 80.5,33.37 80.5,45.37 80.5,33.37
  text "*" at -73,24.21 h50
Mechanical 15:
  region: -63.37,-100.5 -100.5,-100.5 -100.5,-63.37 -116.5,-63.37 -116.5,63.37 -100.5,63.37 -100.5,100.5 -63.37,100.5 -63.37,116.5 63.37,116.5 63.37,100.5 100.5,100.5 100.5,63.37 116.5,63.37 116.5,-63.37 100.5,-63.37 100.5,-100.5 63.37,-100.5 63.37,-116.5 -63.37,-116.5
  lines w6: -116.5,-63.37 -100.5,-63.37 -100.5,-100.5 -63.37,-100.5 -63.37,-116.5 63.37,-116.5 63.37,-100.5 100.5,-100.5 100.5,-63.37 116.5,-63.37 116.5,63.37 100.5,63.37 100.5,100.5 63.37,100.5 63.37,116.5 -63.37,116.5 -63.37,100.5 -100.5,100.5 -100.5,63.37 -116.5,63.37 -116.5,-63.37
3D body: height 10, standoff 0, extent 0,0 10,10

## CP_24_2 [mil]
pads (25):
  rect 32x8 smd paste+0 mask+0: 1(-74.5,49.21) 2(-74.5,29.53) 3(-74.5,9.84) 4(-74.5,-9.84) 5(-74.5,-29.53) 6(-74.5,-49.21) 13(74.5,-49.21) 14(74.5,-29.53) 15(74.5,-9.84) 16(74.5,9.84) 17(74.5,29.53) 18(74.5,49.21)
  rect 8x32 smd paste+0 mask+0: 7(-49.21,-74.5) 8(-29.53,-74.5) 9(-9.84,-74.5) 10(9.84,-74.5) 11(29.53,-74.5) 12(49.21,-74.5) 19(49.21,74.5) 20(29.53,74.5) 21(9.84,74.5) 22(-9.84,74.5) 23(-29.53,74.5) 24(-49.21,74.5)
  rect 96x96 smd paste-47.5 mask+0: 25(0,0)
Top Overlay:
  region: 17.34,-100.5 2.34,-100.5 2.34,-110.5 17.34,-110.5
  region: 37.03,100.5 22.03,100.5 22.03,110.5 37.03,110.5
  lines w6: -83.5,-66.31 -83.5,-83.5 -66.31,-83.5 ; -83.5,66.31 -83.5,83.5 -66.31,83.5 ; 66.31,-83.5 83.5,-83.5 83.5,-66.31 ; 66.31,83.5 83.5,83.5 83.5,66.31
  text "*" at -128,34.06 h50
Top Paste:
  region: 48,48 -48,48 -48,-48 48,-48
Mechanical 5:
  region: 115.5,-115.5 -115.5,-115.5 -115.5,115.5 115.5,115.5
Mechanical 13:
  lines w1: -78.5,28.5 -28.5,78.5 ; -78.5,-78.5 78.5,-78.5 78.5,78.5 -78.5,78.5 -78.5,-78.5 ; -78.5,-55.21 -78.5,-43.21 -78.5,-55.21 ; -78.5,-35.53 -78.5,-23.53 -78.5,-35.53 ; -78.5,-15.84 -78.5,-3.84 -78.5,-15.84 ; -78.5,3.84 -78.5,15.84 -78.5,3.84 ; -78.5,23.53 -78.5,35.53 -78.5,23.53 ; -78.5,43.21 -78.5,55.21 -78.5,43.21 ; -55.21,-78.5 -43.21,-78.5 -55.21,-78.5 ; -55.21,78.5 -43.21,78.5 -55.21,78.5 ; -35.53,-78.5 -23.53,-78.5 -35.53,-78.5 ; -35.53,78.5 -23.53,78.5 -35.53,78.5 ; -15.84,-78.5 -3.84,-78.5 -15.84,-78.5 ; -15.84,78.5 -3.84,78.5 -15.84,78.5 ; 3.84,-78.5 15.84,-78.5 3.84,-78.5 ; 3.84,78.5 15.84,78.5 3.84,78.5 ; 23.53,-78.5 35.53,-78.5 23.53,-78.5 ; 23.53,78.5 35.53,78.5 23.53,78.5 ; 43.21,-78.5 55.21,-78.5 43.21,-78.5 ; 43.21,78.5 55.21,78.5 43.21,78.5 ; 78.5,-55.21 78.5,-43.21 78.5,-55.21 ; 78.5,-35.53 78.5,-23.53 78.5,-35.53 ; 78.5,-15.84 78.5,-3.84 78.5,-15.84 ; 78.5,3.84 78.5,15.84 78.5,3.84 ; 78.5,23.53 78.5,35.53 78.5,23.53 ; 78.5,43.21 78.5,55.21 78.5,43.21
  text "*" at -71,34.06 h50
Mechanical 15:
  region: -63.21,-88.5 -88.5,-88.5 -88.5,-63.21 -100.5,-63.21 -100.5,63.21 -88.5,63.21 -88.5,88.5 -63.21,88.5 -63.21,100.5 63.21,100.5 63.21,88.5 88.5,88.5 88.5,63.21 100.5,63.21 100.5,-63.21 88.5,-63.21 88.5,-88.5 63.21,-88.5 63.21,-100.5 -63.21,-100.5
  lines w6: -100.5,-63.21 -88.5,-63.21 -88.5,-88.5 -63.21,-88.5 -63.21,-100.5 63.21,-100.5 63.21,-88.5 88.5,-88.5 88.5,-63.21 100.5,-63.21 100.5,63.21 88.5,63.21 88.5,88.5 63.21,88.5 63.21,100.5 -63.21,100.5 -63.21,88.5 -88.5,88.5 -88.5,63.21 -100.5,63.21 -100.5,-63.21
3D body: height 10, standoff 0, extent 0,0 10,10

## CP_24_2-L [mil]
pads (25):
  rect 28x8 smd paste+0 mask+0: 1(-72.5,49.21) 2(-72.5,29.53) 3(-72.5,9.84) 4(-72.5,-9.84) 5(-72.5,-29.53) 6(-72.5,-49.21) 13(72.5,-49.21) 14(72.5,-29.53) 15(72.5,-9.84) 16(72.5,9.84) 17(72.5,29.53) 18(72.5,49.21)
  rect 8x28 smd paste+0 mask+0: 7(-49.21,-72.5) 8(-29.53,-72.5) 9(-9.84,-72.5) 10(9.84,-72.5) 11(29.53,-72.5) 12(49.21,-72.5) 19(49.21,72.5) 20(29.53,72.5) 21(9.84,72.5) 22(-9.84,72.5) 23(-29.53,72.5) 24(-49.21,72.5)
  rect 96x96 smd paste-47.5 mask+0: 25(0,0)
Top Overlay:
  region: 17.34,-96.5 2.34,-96.5 2.34,-106.5 17.34,-106.5
  region: 37.03,96.5 22.03,96.5 22.03,106.5 37.03,106.5
  lines w6: -83.5,-66.31 -83.5,-83.5 -66.31,-83.5 ; -83.5,66.31 -83.5,83.5 -66.31,83.5 ; 66.31,-83.5 83.5,-83.5 83.5,-66.31 ; 66.31,83.5 83.5,83.5 83.5,66.31
  text "*" at -124,34.06 h50
Top Paste:
  region: 48,48 -48,48 -48,-48 48,-48
Mechanical 5:
  region: 105.5,-105.5 -105.5,-105.5 -105.5,105.5 105.5,105.5
Mechanical 13:
  lines w1: -78.5,28.5 -28.5,78.5 ; -78.5,-78.5 78.5,-78.5 78.5,78.5 -78.5,78.5 -78.5,-78.5 ; -78.5,-55.21 -78.5,-43.21 -78.5,-55.21 ; -78.5,-35.53 -78.5,-23.53 -78.5,-35.53 ; -78.5,-15.84 -78.5,-3.84 -78.5,-15.84 ; -78.5,3.84 -78.5,15.84 -78.5,3.84 ; -78.5,23.53 -78.5,35.53 -78.5,23.53 ; -78.5,43.21 -78.5,55.21 -78.5,43.21 ; -55.21,-78.5 -43.21,-78.5 -55.21,-78.5 ; -55.21,78.5 -43.21,78.5 -55.21,78.5 ; -35.53,-78.5 -23.53,-78.5 -35.53,-78.5 ; -35.53,78.5 -23.53,78.5 -35.53,78.5 ; -15.84,-78.5 -3.84,-78.5 -15.84,-78.5 ; -15.84,78.5 -3.84,78.5 -15.84,78.5 ; 3.84,-78.5 15.84,-78.5 3.84,-78.5 ; 3.84,78.5 15.84,78.5 3.84,78.5 ; 23.53,-78.5 35.53,-78.5 23.53,-78.5 ; 23.53,78.5 35.53,78.5 23.53,78.5 ; 43.21,-78.5 55.21,-78.5 43.21,-78.5 ; 43.21,78.5 55.21,78.5 43.21,78.5 ; 78.5,-55.21 78.5,-43.21 78.5,-55.21 ; 78.5,-35.53 78.5,-23.53 78.5,-35.53 ; 78.5,-15.84 78.5,-3.84 78.5,-15.84 ; 78.5,3.84 78.5,15.84 78.5,3.84 ; 78.5,23.53 78.5,35.53 78.5,23.53 ; 78.5,43.21 78.5,55.21 78.5,43.21
  text "*" at -71,34.06 h50
Mechanical 15:
  region: -57.21,-82.5 -82.5,-82.5 -82.5,-57.21 -90.5,-57.21 -90.5,57.21 -82.5,57.21 -82.5,82.5 -57.21,82.5 -57.21,90.5 57.21,90.5 57.21,82.5 82.5,82.5 82.5,57.21 90.5,57.21 90.5,-57.21 82.5,-57.21 82.5,-82.5 57.21,-82.5 57.21,-90.5 -57.21,-90.5
  lines w6: -90.5,-57.21 -82.5,-57.21 -82.5,-82.5 -57.21,-82.5 -57.21,-90.5 57.21,-90.5 57.21,-82.5 82.5,-82.5 82.5,-57.21 90.5,-57.21 90.5,57.21 82.5,57.21 82.5,82.5 57.21,82.5 57.21,90.5 -57.21,90.5 -57.21,82.5 -82.5,82.5 -82.5,57.21 -90.5,57.21 -90.5,-57.21
3D body: height 10, standoff 0, extent 0,0 10,10